# Altium footprint library SMT.PcbLib: 151 footprints (part 7 of 10)
Each footprint in its own frame and in the unit in brackets; x right, y up, seen from the top. Pads: shape width x height; smd on the part's side, far side on the other; paste and mask are expansions set on the pad; w line width, h text height; cw(c..) or ccw(c..) is an arc to the next point about the centre after c.
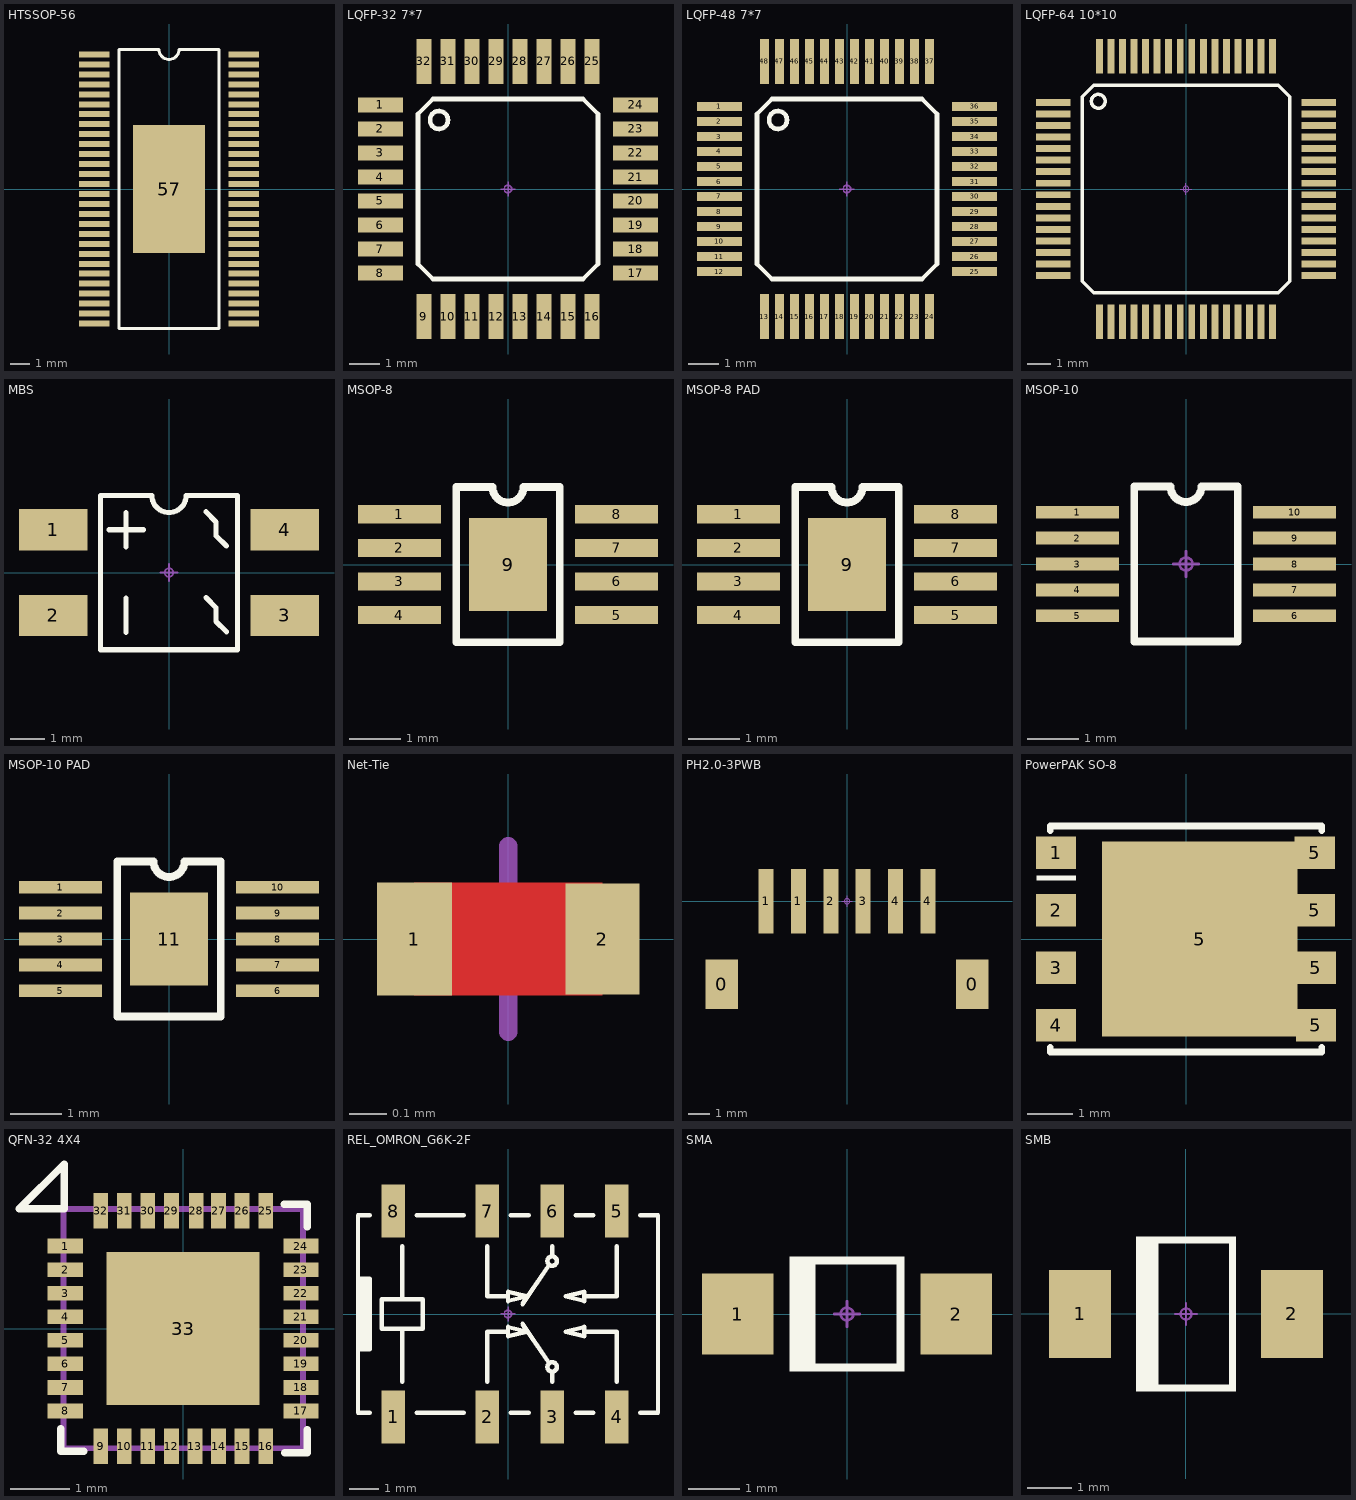
[diagram p6: the footprints below, top view; thin cyan lines are the x and y axes]

## HTSSOP-56 [mm]
pads (57):
  rect 1.55x0.3 smd mask+0.051: 1(-3.75,6.754) 2(-3.75,6.254) 3(-3.75,5.754) 4(-3.75,5.254) 5(-3.75,4.754) 6(-3.75,4.253) 7(-3.75,3.753) 8(-3.75,3.252) 9(-3.75,2.752) 10(-3.75,2.252) 11(-3.75,1.751) 12(-3.75,1.251) 13(-3.75,0.751) 14(-3.75,0.25) 15(-3.75,-0.25) 16(-3.75,-0.751) 17(-3.75,-1.251) 18(-3.75,-1.751) 19(-3.75,-2.252) 20(-3.75,-2.752) 21(-3.75,-3.252) 22(-3.75,-3.753) 23(-3.75,-4.253) 24(-3.75,-4.754) 25(-3.75,-5.254) 26(-3.75,-5.754) 27(-3.75,-6.254) 28(-3.75,-6.754) 29(3.75,-6.754) 30(3.75,-6.254) 31(3.75,-5.754) 32(3.75,-5.254) 33(3.75,-4.754) 34(3.75,-4.253) 35(3.75,-3.753) 36(3.75,-3.252) 37(3.75,-2.752) 38(3.75,-2.252) 39(3.75,-1.751) 40(3.75,-1.251) 41(3.75,-0.751) 42(3.75,-0.25) 43(3.75,0.25) 44(3.75,0.751) 45(3.75,1.251) 46(3.75,1.751) 47(3.75,2.252) 48(3.75,2.752) 49(3.75,3.252) 50(3.75,3.753) 51(3.75,4.253) 52(3.75,4.754) 53(3.75,5.254) 54(3.75,5.754) 55(3.75,6.254) 56(3.75,6.754)
  rect 3.6x6.4 smd: 57(0,0)
Top Overlay:
  lines w0.152: -2.5,-7 2.5,-7 2.5,7 0.5,7 cw(c0,7) -0.5,7 -2.5,7 -2.5,-7
Mechanical 15:
  circle w0.05: c0,0 r0.125
  lines w0.05: -0.25,0 0.25,0 ; 0,-0.25 0,0.25
3D body "HTSSOP-56.STEP": height 1.1, standoff 0, extent -4.1,-7 4.1,7

## LQFP-32 7*7 [mm]
pads (32):
  rect 1.5x0.5 smd paste-0.02: 1(-4.25,2.8) 2(-4.25,2) 3(-4.25,1.2) 4(-4.25,0.4) 5(-4.25,-0.4) 6(-4.25,-1.2) 7(-4.25,-2) 8(-4.25,-2.8) 17(4.25,-2.8) 18(4.25,-2) 19(4.25,-1.2) 20(4.25,-0.4) 21(4.25,0.4) 22(4.25,1.2) 23(4.25,2) 24(4.25,2.8)
  rect 0.5x1.5 smd paste-0.02: 9(-2.8,-4.25) 10(-2,-4.25) 11(-1.2,-4.25) 12(-0.4,-4.25) 13(0.4,-4.25) 14(1.2,-4.25) 15(2,-4.25) 16(2.8,-4.25) 25(2.8,4.25) 26(2,4.25) 27(1.2,4.25) 28(0.4,4.25) 29(-0.4,4.25) 30(-1.2,4.25) 31(-2,4.25) 32(-2.8,4.25)
Top Overlay:
  circle w0.152: c-2.3,2.3 r0.3
  lines w0.152: -3,-2.5 -3,2.5 -2.5,3 2.5,3 3,2.5 3,-2.5 2.5,-3 -2.5,-3 -3,-2.5
Mechanical 15:
  circle w0.05: c0,0 r0.125
  lines w0.05: -0.25,0 0.25,0 ; 0,-0.25 0,0.25
3D body "User Library-TQFP32-1.step": height 1.1, standoff 0, extent -4.509,-4.509 4.509,4.509

## LQFP-48 7*7 [mm]
pads (48):
  rect 1.5x0.3 smd paste-0.02: 1(-4.25,2.75) 2(-4.25,2.25) 3(-4.25,1.75) 4(-4.25,1.25) 5(-4.25,0.75) 6(-4.25,0.25) 7(-4.25,-0.25) 8(-4.25,-0.75) 9(-4.25,-1.25) 10(-4.25,-1.75) 11(-4.25,-2.25) 12(-4.25,-2.75) 25(4.25,-2.75) 26(4.25,-2.25) 27(4.25,-1.75) 28(4.25,-1.25) 29(4.25,-0.75) 30(4.25,-0.25) 31(4.25,0.25) 32(4.25,0.75) 33(4.25,1.25) 34(4.25,1.75) 35(4.25,2.25) 36(4.25,2.75)
  rect 0.3x1.5 smd paste-0.02: 13(-2.75,-4.25) 14(-2.25,-4.25) 15(-1.75,-4.25) 16(-1.25,-4.25) 17(-0.75,-4.25) 18(-0.25,-4.25) 19(0.25,-4.25) 20(0.75,-4.25) 21(1.25,-4.25) 22(1.75,-4.25) 23(2.25,-4.25) 24(2.75,-4.25) 37(2.75,4.25) 38(2.25,4.25) 39(1.75,4.25) 40(1.25,4.25) 41(0.75,4.25) 42(0.25,4.25) 43(-0.25,4.25) 44(-0.75,4.25) 45(-1.25,4.25) 46(-1.75,4.25) 47(-2.25,4.25) 48(-2.75,4.25)
Top Overlay:
  circle w0.152: c-2.3,2.3 r0.3
  lines w0.152: -3,-2.5 -3,2.5 -2.5,3 2.5,3 3,2.5 3,-2.5 2.5,-3 -2.5,-3 -3,-2.5
Mechanical 15:
  circle w0.05: c0,0 r0.125
  lines w0.05: -0.25,0 0.25,0 ; 0,-0.25 0,0.25
3D body "TQFP48.STEP": height 1.1, standoff 0, extent -4.509,-4.509 4.509,4.509

## LQFP-64 10*10 [mm]
pads (64):
  rect 1.5x0.3 smd: 1(-5.75,3.75) 2(-5.75,3.25) 3(-5.75,2.75) 4(-5.75,2.25) 5(-5.75,1.75) 6(-5.75,1.25) 7(-5.75,0.75) 8(-5.75,0.25) 9(-5.75,-0.25) 10(-5.75,-0.75) 11(-5.75,-1.25) 12(-5.75,-1.75) 13(-5.75,-2.25) 14(-5.75,-2.75) 15(-5.75,-3.25) 16(-5.75,-3.75) 33(5.75,-3.75) 34(5.75,-3.25) 35(5.75,-2.75) 36(5.75,-2.25) 37(5.75,-1.75) 38(5.75,-1.25) 39(5.75,-0.75) 40(5.75,-0.25) 41(5.75,0.25) 42(5.75,0.75) 43(5.75,1.25) 44(5.75,1.75) 45(5.75,2.25) 46(5.75,2.75) 47(5.75,3.25) 48(5.75,3.75)
  rect 0.3x1.5 smd: 17(-3.75,-5.75) 18(-3.25,-5.75) 19(-2.75,-5.75) 20(-2.25,-5.75) 21(-1.75,-5.75) 22(-1.25,-5.75) 23(-0.75,-5.75) 24(-0.25,-5.75) 25(0.25,-5.75) 26(0.75,-5.75) 27(1.25,-5.75) 28(1.75,-5.75) 29(2.25,-5.75) 30(2.75,-5.75) 31(3.25,-5.75) 32(3.75,-5.75) 49(3.75,5.75) 50(3.25,5.75) 51(2.75,5.75) 52(2.25,5.75) 53(1.75,5.75) 54(1.25,5.75) 55(0.75,5.75) 56(0.25,5.75) 57(-0.25,5.75) 58(-0.75,5.75) 59(-1.25,5.75) 60(-1.75,5.75) 61(-2.25,5.75) 62(-2.75,5.75) 63(-3.25,5.75) 64(-3.75,5.75)
Top Overlay:
  circle w0.152: c-3.8,3.8 r0.3
  lines w0.152: -4.5,-4 -4,-4.5 4,-4.5 4.5,-4 4.5,4 4,4.5 -4,4.5 -4.5,4 -4.5,-4
Mechanical 15:
  circle w0.05: c0,0 r0.125
  lines w0.05: -0.25,0 0.25,0 ; 0,-0.25 0,0.25
3D body "lqfp-64.stp": height 1.6, standoff -0.02, extent -6,-6 6,6

## MBS [mm]
pads (4):
  rect 2x1.2 smd: 1(-3.375,1.25) 2(-3.375,-1.25) 3(3.375,-1.25) 4(3.375,1.25)
Top Overlay:
  lines w0.152: -1.75,1.25 -0.75,1.25 ; -1.25,-1.75 -1.25,-0.75 ; -1.25,0.75 -1.25,1.75 ; 1.075,-0.725 1.375,-1.025 1.375,-1.425 1.675,-1.725 ; 1.075,1.775 1.375,1.475 1.375,1.075 1.675,0.775 ; -2,-2.25 2,-2.25 2,2.25 0.5,2.25 cw(c0,2.25) -0.5,2.25 -2,2.25 -2,-2.25
Mechanical 15:
  circle w0.05: c0,0 r0.125
  lines w0.05: -0.25,0 0.25,0 ; 0,-0.25 0,0.25
3D body "mini-dip4.stp": height 1.55, standoff -0.06, extent -3.5,-2.35 3.5,2.35

## MSOP-8 [mm]
pads (9):
  rect 1.6x0.35 smd paste-0.02: 1(-2.1,0.975) 2(-2.1,0.325) 3(-2.1,-0.325) 4(-2.1,-0.975) 5(2.1,-0.975) 6(2.1,-0.325) 7(2.1,0.325) 8(2.1,0.975)
  rect 1.5x1.8 smd paste-0.1: 9(0,0)
Top Overlay:
  lines w0.152: -1,-1.5 1,-1.5 1,1.5 0.3,1.5 cw(c0,1.5) -0.3,1.5 -1,1.5 -1,-1.5
Mechanical 15:
  circle w0.05: c0,0 r0.125
  lines w0.05: -0.25,0 0.25,0 ; 0,-0.25 0,0.25
3D body "SW3dPS-MSOP8.STEP": height 1.05, standoff -0.05, extent -2.469,-1.537 2.469,1.563

## MSOP-8 PAD [mm]
pads (9):
  rect 1.6x0.35 smd paste-0.02: 1(-2.1,0.975) 2(-2.1,0.325) 3(-2.1,-0.325) 4(-2.1,-0.975) 5(2.1,-0.975) 6(2.1,-0.325) 7(2.1,0.325) 8(2.1,0.975)
  rect 1.5x1.8 smd paste-0.1: 9(0,0)
Top Overlay:
  lines w0.152: -1,-1.5 1,-1.5 1,1.5 0.3,1.5 cw(c0,1.5) -0.3,1.5 -1,1.5 -1,-1.5
Mechanical 15:
  circle w0.05: c0,0 r0.125
  lines w0.05: -0.25,0 0.25,0 ; 0,-0.25 0,0.25
3D body "SW3dPS-MSOP8.STEP": height 1.05, standoff -0.05, extent -2.469,-1.537 2.469,1.563

## MSOP-10 [mm]
pads (10):
  rect 1.6x0.25 smd paste-0.02: 1(-2.1,1) 2(-2.1,0.5) 3(-2.1,0) 4(-2.1,-0.5) 5(-2.1,-1) 6(2.1,-1) 7(2.1,-0.5) 8(2.1,0) 9(2.1,0.5) 10(2.1,1)
Top Overlay:
  lines w0.152: -0.3,1.497 -1,1.497 -1,-1.5 1,-1.5 1,1.497 0.3,1.497 ; -0.3,1.5 ccw(c0,1.5) 0.3,1.5
Mechanical 15:
  circle w0.05: c0,0 r0.125
  lines w0.05: -0.25,0 0.25,0 ; 0,-0.25 0,0.25
3D body "DGQ0010.stp": height 0.94, standoff -0.02, extent -2.451,-1.499 2.451,1.499

## MSOP-10 PAD [mm]
pads (11):
  rect 1.6x0.25 smd paste-0.02: 1(-2.1,1) 2(-2.1,0.5) 3(-2.1,0) 4(-2.1,-0.5) 5(-2.1,-1) 6(2.1,-1) 7(2.1,-0.5) 8(2.1,0) 9(2.1,0.5) 10(2.1,1)
  rect 1.5x1.8 smd paste-0.1: 11(0,0)
Top Overlay:
  lines w0.152: -0.3,1.497 -1,1.497 -1,-1.5 1,-1.5 1,1.497 0.3,1.497 ; -0.3,1.5 ccw(c0,1.5) 0.3,1.5
Mechanical 15:
  circle w0.05: c0,0 r0.125
  lines w0.05: -0.25,0 0.25,0 ; 0,-0.25 0,0.25
3D body "DGQ0010.stp": height 0.94, standoff -0.02, extent -2.451,-1.499 2.451,1.499

## Net-Tie [mil]
pads (2):
  rect 8x12 smd paste-5 mask-5: 1(-10,0)
  rect 7.87x11.81 smd paste-5 mask-5: 2(10,0)
Top Layer:
  region: -10,6 10,6 10,-6 -10,-6
Mechanical 15:
  circle w1.97: c0,0 r4.92
  lines w1.97: -9.84,0 9.84,0 ; 0,-9.84 0,9.84

## PH2.0-3PWB [mm]
pads (8):
  rect 1.5x2.3 smd: 0(-5.8,-3.85) 0(5.8,-3.85)
  rect 0.7x3 smd: 1(-3.75,0) 1(-2.25,0) 2(-0.75,0) 3(0.75,0) 4(2.25,0) 4(3.75,0)
Mechanical 15:
  circle w0.05: c0,0 r0.125
  lines w0.05: -0.25,0 0.25,0 ; 0,-0.25 0,0.25

## PowerPAK SO-8 [mil]
height 43.31
pads (9):
  rect 35x28 smd paste-1.97 mask+2: 1(-113,75) 2(-113,25) 3(-113,-25) 4(-113,-75) 5(112,25) 5(112,75) 5(113,-75) 5(113,-25)
  rect 170x170 smd paste-86.61 mask+2: 5(12,0)
Top Overlay:
  region: -130,54.97 -96,54.97 -96,51.03 -130,51.03
  lines w6: -118.11,-94.49 -118.11,-98.43 118.11,-98.43 118.11,-94.49 ; -118.11,94.49 -118.11,98.43 118.11,98.43 118.11,94.49
Top Paste:
  rectangle: -55,-75 -10,-10
  rectangle: -55,10 -10,75
  rectangle: 10,-75 75,-10
  rectangle: 10,10 75,75
Mechanical 15:
  circle w1.97: c0,0 r4.92
  lines w1.97: -9.84,0 9.84,0 ; 0,-9.84 0,9.84
3D body "TI_DQJ8A.stp": height 43.7, standoff 0, extent -120.07,-98.42 120.09,98.43

## QFN-32 4X4 [mm]
pads (33):
  rect 0.6x0.25 smd: 1(-2,1.4) 2(-2,1) 3(-2,0.6) 4(-2,0.2) 5(-2,-0.2) 6(-2,-0.6) 7(-2,-1) 8(-2,-1.4) 17(2,-1.4) 18(2,-1) 19(2,-0.6) 20(2,-0.2) 21(2,0.2) 22(2,0.6) 23(2,1) 24(2,1.4)
  rect 0.25x0.6 smd: 9(-1.4,-2) 10(-1,-2) 11(-0.6,-2) 12(-0.2,-2) 13(0.2,-2) 14(0.6,-2) 15(1,-2) 16(1.4,-2) 25(1.4,2) 26(1,2) 27(0.6,2) 28(0.22,2) 29(-0.2,2) 30(-0.6,2) 31(-1,2) 32(-1.4,2)
  rect 2.6x2.6 smd mask+0.051: 33(0,0)
Top Overlay:
  lines w0.127: -2.083,-1.702 -2.083,-2.083 -1.689,-2.083 ; 1.714,2.108 2.108,2.108 2.108,1.727 ; 1.727,-2.108 2.108,-2.108 2.108,-1.714 ; -2.781,2.032 -2.019,2.032 -2.019,2.667 -2.019,2.794 -2.781,2.032
Mechanical 15:
  lines w0.1: -2.032,-2.032 -2.032,2.032 2.032,2.032 2.032,-2.032 -2.032,-2.032
3D body "qfn32-4x4.stp": height 0.8, standoff 0, extent -2.02,-2.02 2.02,2.02
3D body "p060-025.stp": height 0.01, standoff 0, extent -1.525,1.7 -1.275,2.3
3D body "p060-025.stp": height 0.01, standoff 0, extent -1.125,1.7 -0.875,2.3
3D body "p060-025.stp": height 0.01, standoff 0, extent -0.725,1.7 -0.475,2.3
3D body "p060-025.stp": height 0.01, standoff 0, extent -0.325,1.7 -0.075,2.3
3D body "p060-025.stp": height 0.01, standoff 0, extent 0.095,1.7 0.345,2.3
3D body "p060-025.stp": height 0.01, standoff 0, extent 0.475,1.7 0.725,2.3
3D body "p060-025.stp": height 0.01, standoff 0, extent 0.875,1.7 1.125,2.3
3D body "p060-025.stp": height 0.01, standoff 0, extent 1.275,1.7 1.525,2.3
3D body "p060-025.stp": height 0.01, standoff 0, extent 1.275,-2.3 1.525,-1.7
3D body "p060-025.stp": height 0.01, standoff 0, extent 0.875,-2.3 1.125,-1.7
3D body "p060-025.stp": height 0.01, standoff 0, extent 0.475,-2.3 0.725,-1.7
3D body "p060-025.stp": height 0.01, standoff 0, extent 0.075,-2.3 0.325,-1.7
3D body "p060-025.stp": height 0.01, standoff 0, extent -0.325,-2.3 -0.075,-1.7
3D body "p060-025.stp": height 0.01, standoff 0, extent -0.725,-2.3 -0.475,-1.7
3D body "p060-025.stp": height 0.01, standoff 0, extent -1.125,-2.3 -0.875,-1.7
3D body "p060-025.stp": height 0.01, standoff 0, extent -1.525,-2.3 -1.275,-1.7
3D body "p060-025.stp": height 0.01, standoff 0, extent -2.3,-1.525 -1.7,-1.275
3D body "p060-025.stp": height 0.01, standoff 0, extent -2.3,-1.125 -1.7,-0.875
3D body "p060-025.stp": height 0.01, standoff 0, extent -2.3,-0.725 -1.7,-0.475
3D body "p060-025.stp": height 0.01, standoff 0, extent -2.3,-0.325 -1.7,-0.075
3D body "p060-025.stp": height 0.01, standoff 0, extent -2.3,0.075 -1.7,0.325
3D body "p060-025.stp": height 0.01, standoff 0, extent -2.3,0.475 -1.7,0.725
3D body "p060-025.stp": height 0.01, standoff 0, extent -2.3,0.875 -1.7,1.125
3D body "p060-025.stp": height 0.01, standoff 0, extent -2.3,1.275 -1.7,1.525
3D body "p060-025.stp": height 0.01, standoff 0, extent 1.7,1.275 2.3,1.525
3D body "p060-025.stp": height 0.01, standoff 0, extent 1.7,0.875 2.3,1.125
3D body "p060-025.stp": height 0.01, standoff 0, extent 1.7,0.475 2.3,0.725
3D body "p060-025.stp": height 0.01, standoff 0, extent 1.7,0.075 2.3,0.325
3D body "p060-025.stp": height 0.01, standoff 0, extent 1.7,-0.325 2.3,-0.075
3D body "p060-025.stp": height 0.01, standoff 0, extent 1.7,-0.725 2.3,-0.475
3D body "p060-025.stp": height 0.01, standoff 0, extent 1.7,-1.125 2.3,-0.875
3D body "p060-025.stp": height 0.01, standoff 0, extent 1.7,-1.525 2.3,-1.275

## REL_OMRON_G6K-2F [mm]
pads (8):
  rect 0.8x1.8 smd: 1(-3.9,-3.5) 2(-0.7,-3.5) 3(1.5,-3.5) 4(3.7,-3.5) 5(3.7,3.5) 6(1.5,3.5) 7(-0.7,3.5) 8(-3.9,3.5)
Top Overlay:
  circle w0.152: c1.5,1.8 r0.159
  circle w0.152: c1.5,-1.8 r0.159
  lines w0.152: -5.1,-1.2 -4.7,-1.2 -4.7,1.2 -5.1,1.2 ; -5,-1.2 -5,1.2 ; -4.9,-1.2 -4.9,1.2 ; -4.8,-1.2 -4.8,1.2 ; -4.7,-3.35 -5.1,-3.35 -5.1,3.35 -4.7,3.35 ; -3.6,-2.3 -3.6,-0.5 ; -3.6,0.5 -3.6,2.3 ; -3.1,-3.35 -1.5,-3.35 ; -3.1,3.35 -1.5,3.35 ; -0.7,-2.3 -0.7,-0.6 0,-0.6 ; -0.7,2.3 -0.7,0.6 0,0.6 ; 0.1,-3.35 0.7,-3.35 ; 0.1,3.35 0.7,3.35 ; 0.493,-0.338 1.4,-1.675 ; 0.493,0.338 1.4,1.675 ; 1.5,-2.3 1.5,-2 ; 1.5,2 1.5,2.3 ; 2.3,-3.35 2.9,-3.35 ; 2.3,3.35 2.9,3.35 ; 2.6,-0.6 3.7,-0.6 3.7,-2.3 ; 2.6,0.6 3.7,0.6 3.7,2.3 ; 4.5,-3.35 5.1,-3.35 5.1,3.35 4.5,3.35 ; -4.3,-0.5 -4.3,0.5 -2.9,0.5 -2.9,-0.5 -4.3,-0.5 ; 0,-0.759 0.635,-0.6 0,-0.441 0,-0.759 ; 0,0.441 0,0.759 0.635,0.6 0,0.441 ; 1.965,-0.6 2.6,-0.759 2.6,-0.441 1.965,-0.6 ; 1.965,0.6 2.6,0.441 2.6,0.759 1.965,0.6
Mechanical 15:
  circle w0.05: c0,0 r0.125
  lines w0.05: -0.25,0 0.25,0 ; 0,-0.25 0,0.25
3D body "REL_OMRON_G6K-2F.stp": height 5.4, standoff 0, extent -5.1,-3.9 5.1,3.9

## SMA [mm]
pads (2):
  rect 1.4x1.6 smd paste-0.1: 1(-2.15,0) 2(2.15,0)
Top Overlay:
  region: 0.975,-0.975 0.975,0.975 1.125,0.975 1.125,-0.975
  region: -0.75,-0.975 1.125,-0.975 1.125,-1.125 -0.75,-1.125
  region: -0.75,1.125 1.125,1.125 1.125,0.975 -0.75,0.975
  region: -1.125,1.125 -0.625,1.125 -0.625,-1.125 -1.125,-1.125
Mechanical 15:
  circle w0.05: c0,0 r0.125
  lines w0.05: -0.25,0 0.25,0 ; 0,-0.25 0,0.25
3D body "do214ac.stp": height 1.9, standoff 0.03, extent -2.485,-1.2 2.485,1.2

## SMB [mm]
pads (2):
  rect 1.4x2 smd paste-0.1: 1(-2.4,0) 2(2.4,0)
Top Overlay:
  region: -1.125,1.75 -0.625,1.75 -0.625,-1.75 -1.125,-1.75
  region: -0.75,1.75 1.125,1.75 1.125,1.6 -0.75,1.6
  region: -0.75,-1.75 1.125,-1.75 1.125,-1.6 -0.75,-1.6
  region: 1.125,-1.6 1.125,1.6 0.975,1.6 0.975,-1.6
Mechanical 15:
  circle w0.05: c0,0 r0.125
  lines w0.05: -0.25,0 0.25,0 ; 0,-0.25 0,0.25
3D body "SMB_nominal.stp": height 2.32, standoff 0.02, extent -2.7,-1.8 2.7,1.8